# Altium footprint library PCB_CONNECTORS.PcbLib: 676 footprints (part 43 of 43)
Each footprint in its own frame and in the unit in brackets; x right, y up, seen from the top. Pads: shape width x height; smd on the part's side, far side on the other; paste and mask are expansions set on the pad; w line width, h text height; cw(c..) or ccw(c..) is an arc to the next point about the centre after c.
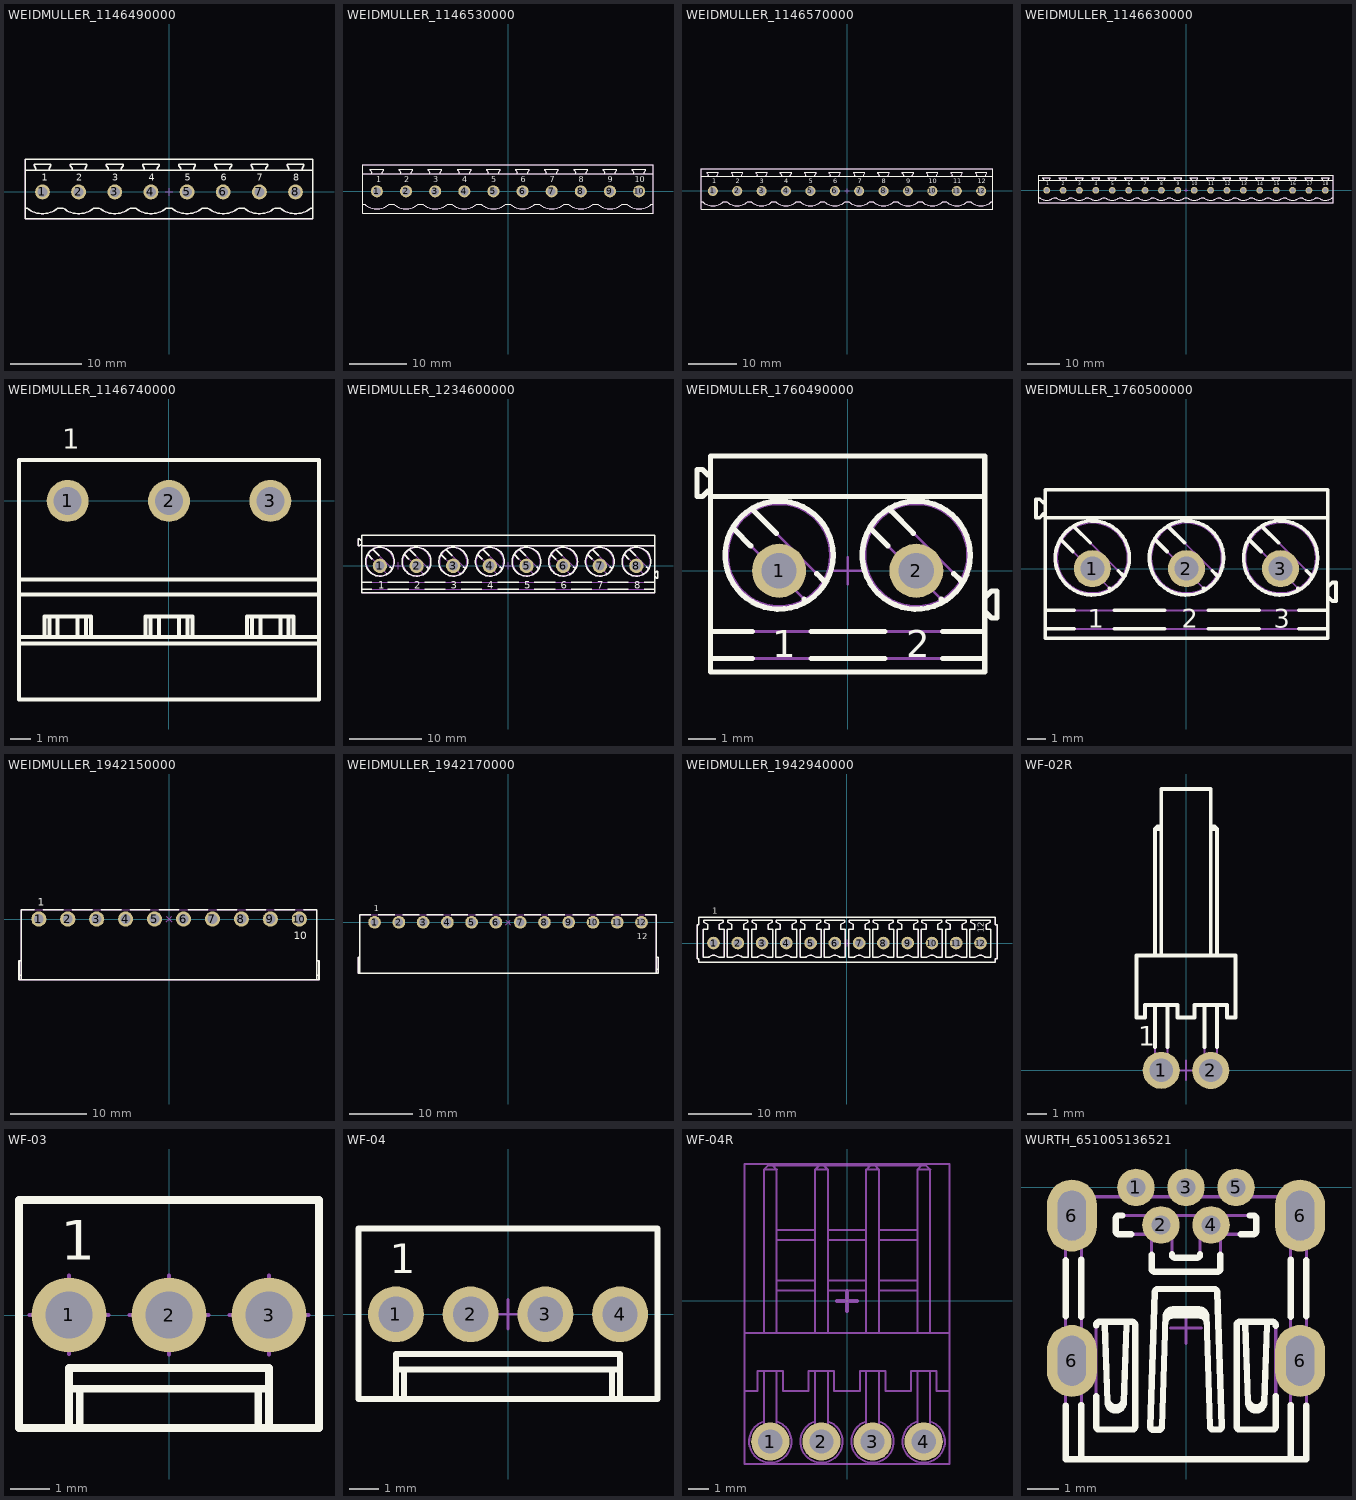
[diagram p42: the footprints below, top view; thin cyan lines are the x and y axes]

## WEIDMULLER_1146490000 [mm] "24A 400 V, Pitch 5.08mm, 8 Positions PCB Male Header, Type SL 5.08HC Serie"
height 12
pads (8):
  round 2.1 hole 1.4: 1(-17.78,0) 2(-12.7,0) 3(-7.62,0) 4(-2.54,0) 5(2.54,0) 6(7.62,0) 7(12.7,0) 8(17.78,0)
Top Overlay:
  lines w0.2: -20.22,-2.26 -19.934,-2.26 ccw(c-17.78,0.24) -15.626,-2.26 -14.854,-2.26 ccw(c-12.7,0.24) -10.546,-2.26 -9.774,-2.26 ccw(c-7.62,0.24) -5.466,-2.26 -4.694,-2.26 ccw(c-2.54,0.24) -0.386,-2.26 0.386,-2.26 ccw(c2.54,0.24) 4.694,-2.26 5.466,-2.26 ccw(c7.62,0.24) 9.774,-2.26 10.546,-2.26 ccw(c12.7,0.24) 14.854,-2.26 15.626,-2.26 ccw(c17.78,0.24) 19.934,-2.26 20.22,-2.26 ; -20.22,3.06 20.22,3.06 ; -18.7,3.06 -18.7,3.323 -18.95,3.68 -18.95,3.88 -16.61,3.88 -16.61,3.68 -16.86,3.323 -16.86,3.06 ; -13.62,3.06 -13.62,3.323 -13.87,3.68 -13.87,3.88 -11.53,3.88 -11.53,3.68 -11.78,3.323 -11.78,3.06 ; -8.54,3.06 -8.54,3.323 -8.79,3.68 -8.79,3.88 -6.45,3.88 -6.45,3.68 -6.7,3.323 -6.7,3.06 ; -3.46,3.06 -3.46,3.323 -3.71,3.68 -3.71,3.88 -1.37,3.88 -1.37,3.68 -1.62,3.323 -1.62,3.06 ; 1.62,3.06 1.62,3.323 1.37,3.68 1.37,3.88 3.71,3.88 3.71,3.68 3.46,3.323 3.46,3.06 ; 6.7,3.06 6.7,3.323 6.45,3.68 6.45,3.88 8.79,3.88 8.79,3.68 8.54,3.323 8.54,3.06 ; 11.78,3.06 11.78,3.323 11.53,3.68 11.53,3.88 13.87,3.88 13.87,3.68 13.62,3.323 13.62,3.06 ; 16.86,3.06 16.86,3.323 16.61,3.68 16.61,3.88 18.95,3.88 18.95,3.68 18.7,3.323 18.7,3.06 ; -20.22,-3.8 -20.22,4.63 20.22,4.63 20.22,-3.8 -20.22,-3.8
  text "8" at 17.44,1.6 h1
  text "7" at 12.36,1.6 h1
  text "3" at -7.96,1.6 h1
  text "1" at -17.915,1.6 h1
  text "2" at -13.04,1.6 h1
  text "4" at -2.88,1.6 h1
  text "5" at 2.2,1.6 h1
  text "6" at 7.28,1.6 h1
Mechanical 8:
  lines w0.1: -18.28,0 -17.78,0 ; -17.78,-0.5 -17.78,0 ; -17.78,0.5 -17.78,0 ; -17.28,0 -17.78,0 ; 2.04,0 2.54,0 ; 2.54,-0.5 2.54,0 ; 2.54,0.5 2.54,0 ; 3.04,0 2.54,0 ; 7.12,0 7.62,0 ; 7.62,-0.5 7.62,0 ; 7.62,0.5 7.62,0 ; 8.12,0 7.62,0 ; 12.2,0 12.7,0 ; 12.7,-0.5 12.7,0 ; 12.7,0.5 12.7,0 ; 13.2,0 12.7,0 ; 17.28,0 17.78,0 ; 17.78,-0.5 17.78,0 ; 17.78,0.5 17.78,0 ; 18.28,0 17.78,0 ; -12.7,0 -12.7,0.5 -12.7,0 ; -12.7,0 -12.2,0 -12.7,0 ; -12.7,0 -12.7,-0.5 -12.7,0 ; -12.7,0 -13.2,0 -12.7,0 ; -8.12,0 -7.62,0 ; -8.12,0 -7.62,0 ; -8.12,0 -7.62,0 ; -8.12,0 -7.62,0 ; -7.62,-0.5 -7.62,0 ; -7.62,-0.5 -7.62,0 ; -7.62,-0.5 -7.62,0 ; -7.62,-0.5 -7.62,0 ; -7.62,0 -7.62,0.5 ; -7.62,0 -7.12,0 ; -7.62,0 -7.62,0.5 ; -7.62,0 -7.12,0 ; -7.62,0 -7.62,0.5 ; -7.62,0 -7.12,0 ; -7.62,0 -7.62,0.5 ; -7.62,0 -7.12,0 ; -2.54,0 -2.54,0.5 -2.54,0 ; -2.54,0 -2.04,0 -2.54,0 ; -2.54,0 -2.54,-0.5 -2.54,0 ; -2.54,0 -3.04,0 -2.54,0 ; -0.5,0 0,0 ; -0.5,0 0,0 ; -0.5,0 0,0 ; -0.5,0 0,0 ; 0,-0.5 0,0 ; 0,-0.5 0,0 ; 0,-0.5 0,0 ; 0,-0.5 0,0 ; 0,0 0,0.5 ; 0,0 0.5,0 ; 0,0 0,0.5 ; 0,0 0.5,0 ; 0,0 0,0.5 ; 0,0 0.5,0 ; 0,0 0,0.5 ; 0,0 0.5,0
Mechanical 14:
  lines w0.1: -20.22,-2.26 -19.934,-2.26 ccw(c-17.78,0.24) -15.626,-2.26 -14.854,-2.26 ccw(c-12.7,0.24) -10.546,-2.26 -9.774,-2.26 ccw(c-7.62,0.24) -5.466,-2.26 -4.694,-2.26 ccw(c-2.54,0.24) -0.386,-2.26 0.386,-2.26 ccw(c2.54,0.24) 4.694,-2.26 5.466,-2.26 ccw(c7.62,0.24) 9.774,-2.26 10.546,-2.26 ccw(c12.7,0.24) 14.854,-2.26 15.626,-2.26 ccw(c17.78,0.24) 19.934,-2.26 20.22,-2.26 ; -20.22,3.06 20.22,3.06 ; -18.7,3.06 -18.7,3.323 -18.95,3.68 -18.95,3.88 -16.61,3.88 -16.61,3.68 -16.86,3.323 -16.86,3.06 ; -13.62,3.06 -13.62,3.323 -13.87,3.68 -13.87,3.88 -11.53,3.88 -11.53,3.68 -11.78,3.323 -11.78,3.06 ; -8.54,3.06 -8.54,3.323 -8.79,3.68 -8.79,3.88 -6.45,3.88 -6.45,3.68 -6.7,3.323 -6.7,3.06 ; -3.46,3.06 -3.46,3.323 -3.71,3.68 -3.71,3.88 -1.37,3.88 -1.37,3.68 -1.62,3.323 -1.62,3.06 ; 1.62,3.06 1.62,3.323 1.37,3.68 1.37,3.88 3.71,3.88 3.71,3.68 3.46,3.323 3.46,3.06 ; 6.7,3.06 6.7,3.323 6.45,3.68 6.45,3.88 8.79,3.88 8.79,3.68 8.54,3.323 8.54,3.06 ; 11.78,3.06 11.78,3.323 11.53,3.68 11.53,3.88 13.87,3.88 13.87,3.68 13.62,3.323 13.62,3.06 ; 16.86,3.06 16.86,3.323 16.61,3.68 16.61,3.88 18.95,3.88 18.95,3.68 18.7,3.323 18.7,3.06 ; -20.22,-3.8 -20.22,4.63 20.22,4.63 20.22,-3.8 -20.22,-3.8 ; -18.28,-0.332 -18.28,0.332 -18.112,0.5 -17.448,0.5 -17.28,0.332 -17.28,-0.332 -17.44,-0.494 -18.112,-0.5 -18.28,-0.332 ; -13.2,-0.332 -13.2,0.332 -13.032,0.5 -12.368,0.5 -12.2,0.332 -12.2,-0.332 -12.36,-0.494 -13.032,-0.5 -13.2,-0.332 ; -8.12,-0.332 -8.12,0.332 -7.952,0.5 -7.288,0.5 -7.12,0.332 -7.12,-0.332 -7.28,-0.494 -7.952,-0.5 -8.12,-0.332 ; -3.04,-0.332 -3.04,0.332 -2.872,0.5 -2.208,0.5 -2.04,0.332 -2.04,-0.332 -2.2,-0.494 -2.872,-0.5 -3.04,-0.332 ; 2.04,-0.332 2.04,0.332 2.208,0.5 2.872,0.5 3.04,0.332 3.04,-0.332 2.88,-0.494 2.208,-0.5 2.04,-0.332 ; 7.12,-0.332 7.12,0.332 7.288,0.5 7.952,0.5 8.12,0.332 8.12,-0.332 7.96,-0.494 7.288,-0.5 7.12,-0.332 ; 12.2,-0.332 12.2,0.332 12.368,0.5 13.032,0.5 13.2,0.332 13.2,-0.332 13.04,-0.494 12.368,-0.5 12.2,-0.332 ; 17.28,-0.332 17.28,0.332 17.448,0.5 18.112,0.5 18.28,0.332 18.28,-0.332 18.12,-0.494 17.448,-0.5 17.28,-0.332
  text "8" at 17.44,1.6 h1
  text "7" at 12.36,1.6 h1
  text "3" at -7.96,1.6 h1
  text "2" at -13.04,1.6 h1
  text "1" at -17.915,1.6 h1
  text "4" at -2.88,1.6 h1
  text "5" at 2.2,1.6 h1
  text "6" at 7.28,1.6 h1
3D body "WEIDMULLER_1146490000.stp": height 12, standoff -3.2, extent -20.22,-3.8 20.22,4.63

## WEIDMULLER_1146530000 [mm] "24A 400 V, Pitch 5.08mm, 10 Positions PCB Male Header, Type SL 5.08HC Serie"
height 12
pads (10):
  round 2.1 hole 1.4: 1(-22.86,0) 2(-17.78,0) 3(-12.7,0) 4(-7.62,0) 5(-2.54,0) 6(2.54,0) 7(7.62,0) 8(12.7,0) 9(17.78,0) 10(22.86,0)
Top Overlay:
  lines w0.2: -25.3,-2.26 -25.014,-2.26 ccw(c-22.86,0.24) -20.706,-2.26 -19.934,-2.26 ccw(c-17.78,0.24) -15.626,-2.26 -14.854,-2.26 ccw(c-12.7,0.24) -10.546,-2.26 -9.774,-2.26 ccw(c-7.62,0.24) -5.466,-2.26 -4.694,-2.26 ccw(c-2.54,0.24) -0.386,-2.26 0.386,-2.26 ccw(c2.54,0.24) 4.694,-2.26 5.466,-2.26 ccw(c7.62,0.24) 9.774,-2.26 10.546,-2.26 ccw(c12.7,0.24) 14.854,-2.26 15.626,-2.26 ccw(c17.78,0.24) 19.934,-2.26 20.706,-2.26 ccw(c22.86,0.24) 25.014,-2.26 25.3,-2.26 ; -25.3,3.06 25.28,3.06 ; -23.78,3.06 -23.78,3.323 -24.03,3.68 -24.03,3.88 -21.69,3.88 -21.69,3.68 -21.94,3.323 -21.94,3.06 ; -18.7,3.06 -18.7,3.323 -18.95,3.68 -18.95,3.88 -16.61,3.88 -16.61,3.68 -16.86,3.323 -16.86,3.06 ; -13.62,3.06 -13.62,3.323 -13.87,3.68 -13.87,3.88 -11.53,3.88 -11.53,3.68 -11.78,3.323 -11.78,3.06 ; -8.54,3.06 -8.54,3.323 -8.79,3.68 -8.79,3.88 -6.45,3.88 -6.45,3.68 -6.7,3.323 -6.7,3.06 ; -3.46,3.06 -3.46,3.323 -3.71,3.68 -3.71,3.88 -1.37,3.88 -1.37,3.68 -1.62,3.323 -1.62,3.06 ; 1.62,3.06 1.62,3.323 1.37,3.68 1.37,3.88 3.71,3.88 3.71,3.68 3.46,3.323 3.46,3.06 ; 6.7,3.06 6.7,3.323 6.45,3.68 6.45,3.88 8.79,3.88 8.79,3.68 8.54,3.323 8.54,3.06 ; 11.78,3.06 11.78,3.323 11.53,3.68 11.53,3.88 13.87,3.88 13.87,3.68 13.62,3.323 13.62,3.06 ; 16.86,3.06 16.86,3.323 16.61,3.68 16.61,3.88 18.95,3.88 18.95,3.68 18.7,3.323 18.7,3.06 ; 21.94,3.06 21.94,3.323 21.69,3.68 21.69,3.88 24.03,3.88 24.03,3.68 23.78,3.323 23.78,3.06 ; -25.3,-3.8 25.3,-3.8 25.3,4.63 -25.3,4.63 -25.3,-3.8
  text "6" at 2.2,1.6 h1
  text "5" at -2.88,1.6 h1
  text "4" at -7.96,1.6 h1
  text "2" at -18.12,1.6 h1
  text "1" at -22.995,1.6 h1
  text "3" at -13.04,1.6 h1
  text "7" at 7.28,1.6 h1
  text "8" at 12.36,1.6 h1
  text "10" at 22.12,1.6 h1
  text "9" at 17.44,1.6 h1
Mechanical 14:
  drawing of 176 lines, arcs and shapes, not listed
  text "6" at 2.2,1.6 h1
  text "5" at -2.88,1.6 h1
  text "4" at -7.96,1.6 h1
  text "1" at -22.995,1.6 h1
  text "2" at -18.12,1.6 h1
  text "3" at -13.04,1.6 h1
  text "7" at 7.28,1.6 h1
  text "8" at 12.36,1.6 h1
  text "10" at 22.12,1.6 h1
  text "9" at 17.44,1.6 h1
3D body "WEIDMULLER_1146530000.stp": height 12, standoff -3.2, extent -25.3,-3.8 25.3,4.63

## WEIDMULLER_1146570000 [mm] "24A 400 V, Pitch 5.08mm, 12 Positions PCB Male Header, Type SL 5.08HC Serie"
height 12
pads (12):
  round 2.1 hole 1.4: 1(-27.94,0) 2(-22.86,0) 3(-17.78,0) 4(-12.7,0) 5(-7.62,0) 6(-2.54,0) 7(2.54,0) 8(7.62,0) 9(12.7,0) 10(17.78,0) 11(22.86,0) 12(27.94,0)
Top Overlay:
  lines w0.2: -30.38,-2.26 -30.094,-2.26 ccw(c-27.94,0.24) -25.786,-2.26 -25.014,-2.26 ccw(c-22.86,0.24) -20.706,-2.26 -19.934,-2.26 ccw(c-17.78,0.24) -15.626,-2.26 -14.854,-2.26 ccw(c-12.7,0.24) -10.546,-2.26 -9.774,-2.26 ccw(c-7.62,0.24) -5.466,-2.26 -4.694,-2.26 ccw(c-2.54,0.24) -0.386,-2.26 0.386,-2.26 ccw(c2.54,0.24) 4.694,-2.26 5.466,-2.26 ccw(c7.62,0.24) 9.774,-2.26 10.546,-2.26 ccw(c12.7,0.24) 14.854,-2.26 15.626,-2.26 ccw(c17.78,0.24) 19.934,-2.26 20.706,-2.26 ccw(c22.86,0.24) 25.014,-2.26 25.786,-2.26 ccw(c27.94,0.24) 30.094,-2.26 30.38,-2.26 ; -30.38,3.06 30.38,3.06 ; -28.86,3.06 -28.86,3.323 -29.11,3.68 -29.11,3.88 -26.77,3.88 -26.77,3.68 -27.02,3.323 -27.02,3.06 ; -23.78,3.06 -23.78,3.323 -24.03,3.68 -24.03,3.88 -21.69,3.88 -21.69,3.68 -21.94,3.323 -21.94,3.06 ; -18.7,3.06 -18.7,3.323 -18.95,3.68 -18.95,3.88 -16.61,3.88 -16.61,3.68 -16.86,3.323 -16.86,3.06 ; -13.62,3.06 -13.62,3.323 -13.87,3.68 -13.87,3.88 -11.53,3.88 -11.53,3.68 -11.78,3.323 -11.78,3.06 ; -8.54,3.06 -8.54,3.323 -8.79,3.68 -8.79,3.88 -6.45,3.88 -6.45,3.68 -6.7,3.323 -6.7,3.06 ; -3.46,3.06 -3.46,3.323 -3.71,3.68 -3.71,3.88 -1.37,3.88 -1.37,3.68 -1.62,3.323 -1.62,3.06 ; 1.62,3.06 1.62,3.323 1.37,3.68 1.37,3.88 3.71,3.88 3.71,3.68 3.46,3.323 3.46,3.06 ; 6.7,3.06 6.7,3.323 6.45,3.68 6.45,3.88 8.79,3.88 8.79,3.68 8.54,3.323 8.54,3.06 ; 11.78,3.06 11.78,3.323 11.53,3.68 11.53,3.88 13.87,3.88 13.87,3.68 13.62,3.323 13.62,3.06 ; 16.86,3.06 16.86,3.323 16.61,3.68 16.61,3.88 18.95,3.88 18.95,3.68 18.7,3.323 18.7,3.06 ; 21.94,3.06 21.94,3.323 21.69,3.68 21.69,3.88 24.03,3.88 24.03,3.68 23.78,3.323 23.78,3.06 ; 27.02,3.06 27.02,3.323 26.77,3.68 26.77,3.88 29.11,3.88 29.11,3.68 28.86,3.323 28.86,3.06 ; -30.38,-3.8 -30.38,4.63 30.38,4.63 30.38,-3.8 -30.38,-3.8
  text "10" at 17.04,1.6 h1
  text "9" at 12.36,1.6 h1
  text "11" at 22.12,1.6 h1
  text "12" at 27.2,1.6 h1
  text "8" at 7.28,1.6 h1
  text "7" at 2.2,1.6 h1
  text "3" at -18.12,1.6 h1
  text "1" at -28.075,1.6 h1
  text "2" at -23.2,1.6 h1
  text "4" at -13.04,1.6 h1
  text "5" at -7.96,1.6 h1
  text "6" at -2.88,1.6 h1
Mechanical 8:
  lines w0.1: -28.44,0 -27.94,0 ; -27.94,-0.5 -27.94,0 ; -27.94,0.5 -27.94,0 ; -27.44,0 -27.94,0 ; -23.36,0 -22.86,0 ; -22.86,-0.5 -22.86,0 ; -22.86,0.5 -22.86,0 ; -22.36,0 -22.86,0 ; -18.28,0 -17.78,0 ; -17.78,-0.5 -17.78,0 ; -17.78,0.5 -17.78,0 ; -17.28,0 -17.78,0 ; 2.04,0 2.54,0 ; 2.54,-0.5 2.54,0 ; 2.54,0.5 2.54,0 ; 3.04,0 2.54,0 ; 7.12,0 7.62,0 ; 7.62,-0.5 7.62,0 ; 7.62,0.5 7.62,0 ; 8.12,0 7.62,0 ; 12.2,0 12.7,0 ; 12.7,-0.5 12.7,0 ; 12.7,0.5 12.7,0 ; 13.2,0 12.7,0 ; 17.28,0 17.78,0 ; 17.78,-0.5 17.78,0 ; 17.78,0.5 17.78,0 ; 18.28,0 17.78,0 ; 22.36,0 22.86,0 ; 22.86,-0.5 22.86,0 ; 22.86,0.5 22.86,0 ; 23.36,0 22.86,0 ; 27.44,0 27.94,0 ; 27.94,-0.5 27.94,0 ; 27.94,0.5 27.94,0 ; 28.44,0 27.94,0 ; -12.7,0 -12.7,0.5 -12.7,0 ; -12.7,0 -12.2,0 -12.7,0 ; -12.7,0 -12.7,-0.5 -12.7,0 ; -12.7,0 -13.2,0 -12.7,0 ; -8.12,0 -7.62,0 ; -8.12,0 -7.62,0 ; -8.12,0 -7.62,0 ; -8.12,0 -7.62,0 ; -7.62,-0.5 -7.62,0 ; -7.62,-0.5 -7.62,0 ; -7.62,-0.5 -7.62,0 ; -7.62,-0.5 -7.62,0 ; -7.62,0 -7.62,0.5 ; -7.62,0 -7.12,0 ; -7.62,0 -7.62,0.5 ; -7.62,0 -7.12,0 ; -7.62,0 -7.62,0.5 ; -7.62,0 -7.12,0 ; -7.62,0 -7.62,0.5 ; -7.62,0 -7.12,0 ; -2.54,0 -2.54,0.5 -2.54,0 ; -2.54,0 -2.04,0 -2.54,0 ; -2.54,0 -2.54,-0.5 -2.54,0 ; -2.54,0 -3.04,0 -2.54,0 ; -0.5,0 0,0 ; -0.5,0 0,0 ; -0.5,0 0,0 ; -0.5,0 0,0 ; 0,-0.5 0,0 ; 0,-0.5 0,0 ; 0,-0.5 0,0 ; 0,-0.5 0,0 ; 0,0 0,0.5 ; 0,0 0.5,0 ; 0,0 0,0.5 ; 0,0 0.5,0 ; 0,0 0,0.5 ; 0,0 0.5,0 ; 0,0 0,0.5 ; 0,0 0.5,0
Mechanical 14:
  drawing of 210 lines, arcs and shapes, not listed
  text "10" at 17.04,1.6 h1
  text "9" at 12.36,1.6 h1
  text "11" at 22.12,1.6 h1
  text "12" at 27.2,1.6 h1
  text "8" at 7.28,1.6 h1
  text "7" at 2.2,1.6 h1
  text "3" at -18.12,1.6 h1
  text "2" at -23.2,1.6 h1
  text "1" at -28.075,1.6 h1
  text "4" at -13.04,1.6 h1
  text "5" at -7.96,1.6 h1
  text "6" at -2.88,1.6 h1
3D body "WEIDMULLER_1146570000.stp": height 12, standoff -3.2, extent -30.38,-3.8 30.38,4.63

## WEIDMULLER_1146630000 [mm] "24A 400 V, Pitch 5.08mm, 18 Positions PCB Male Header, Type SL 5.08HC Serie"
height 12
pads (18):
  round 2.1 hole 1.4: 1(-43.18,0) 2(-38.1,0) 3(-33.02,0) 4(-27.94,0) 5(-22.86,0) 6(-17.78,0) 7(-12.7,0) 8(-7.62,0) 9(-2.54,0) 10(2.54,0) 11(7.62,0) 12(12.7,0) 13(17.78,0) 14(22.86,0) 15(27.94,0) 16(33.02,0) 17(38.1,0) 18(43.18,0)
Top Overlay:
  drawing of 168 lines, arcs and shapes, not listed
  text "16" at 32.28,1.6 h1
  text "15" at 27.225,1.6 h1
  text "17" at 37.36,1.6 h1
  text "18" at 42.44,1.6 h1
  text "14" at 22.145,1.6 h1
  text "13" at 17.065,1.6 h1
  text "6" at -18.12,1.6 h1
  text "5" at -23.2,1.6 h1
  text "4" at -28.28,1.6 h1
  text "2" at -38.44,1.6 h1
  text "1" at -43.315,1.6 h1
  text "3" at -33.36,1.6 h1
  text "7" at -13.04,1.6 h1
  text "8" at -7.96,1.6 h1
  text "12" at 11.96,1.6 h1
  text "11" at 6.88,1.6 h1
  text "9" at -2.88,1.6 h1
  text "10" at 1.8,1.6 h1
Mechanical 8:
  lines w0.1: -43.68,0 -43.18,0 ; -43.18,-0.5 -43.18,0 ; -43.18,0.5 -43.18,0 ; -42.68,0 -43.18,0 ; -38.6,0 -38.1,0 ; -38.1,-0.5 -38.1,0 ; -38.1,0.5 -38.1,0 ; -37.6,0 -38.1,0 ; -33.52,0 -33.02,0 ; -33.02,-0.5 -33.02,0 ; -33.02,0.5 -33.02,0 ; -32.52,0 -33.02,0 ; -28.44,0 -27.94,0 ; -27.94,-0.5 -27.94,0 ; -27.94,0.5 -27.94,0 ; -27.44,0 -27.94,0 ; -23.36,0 -22.86,0 ; -22.86,-0.5 -22.86,0 ; -22.86,0.5 -22.86,0 ; -22.36,0 -22.86,0 ; -18.28,0 -17.78,0 ; -17.78,-0.5 -17.78,0 ; -17.78,0.5 -17.78,0 ; -17.28,0 -17.78,0 ; 2.04,0 2.54,0 ; 2.54,-0.5 2.54,0 ; 2.54,0.5 2.54,0 ; 3.04,0 2.54,0 ; 7.12,0 7.62,0 ; 7.62,-0.5 7.62,0 ; 7.62,0.5 7.62,0 ; 8.12,0 7.62,0 ; 12.2,0 12.7,0 ; 12.7,-0.5 12.7,0 ; 12.7,0.5 12.7,0 ; 13.2,0 12.7,0 ; 17.28,0 17.78,0 ; 17.78,-0.5 17.78,0 ; 17.78,0.5 17.78,0 ; 18.28,0 17.78,0 ; 22.36,0 22.86,0 ; 22.86,-0.5 22.86,0 ; 22.86,0.5 22.86,0 ; 23.36,0 22.86,0 ; 27.44,0 27.94,0 ; 27.94,-0.5 27.94,0 ; 27.94,0.5 27.94,0 ; 28.44,0 27.94,0 ; 32.52,0 33.02,0 ; 33.02,-0.5 33.02,0 ; 33.02,0.5 33.02,0 ; 33.52,0 33.02,0 ; 37.6,0 38.1,0 ; 38.1,-0.5 38.1,0 ; 38.1,0.5 38.1,0 ; 38.6,0 38.1,0 ; 42.68,0 43.18,0 ; 43.18,-0.5 43.18,0 ; 43.18,0.5 43.18,0 ; 43.68,0 43.18,0 ; -12.7,0 -13.2,0 -12.7,0 ; -12.7,0 -12.7,-0.5 -12.7,0 ; -12.7,0 -12.2,0 -12.7,0 ; -12.7,0 -12.7,0.5 -12.7,0 ; -8.12,0 -7.62,0 ; -8.12,0 -7.62,0 ; -8.12,0 -7.62,0 ; -8.12,0 -7.62,0 ; -7.62,-0.5 -7.62,0 ; -7.62,-0.5 -7.62,0 ; -7.62,-0.5 -7.62,0 ; -7.62,-0.5 -7.62,0 ; -7.62,0 -7.12,0 ; -7.62,0 -7.62,0.5 ; -7.62,0 -7.12,0 ; -7.62,0 -7.62,0.5 ; -7.62,0 -7.12,0 ; -7.62,0 -7.62,0.5 ; -7.62,0 -7.12,0 ; -7.62,0 -7.62,0.5 ; -2.54,0 -3.04,0 -2.54,0 ; -2.54,0 -2.54,-0.5 -2.54,0 ; -2.54,0 -2.04,0 -2.54,0 ; -2.54,0 -2.54,0.5 -2.54,0 ; -0.5,0 0,0 ; -0.5,0 0,0 ; -0.5,0 0,0 ; -0.5,0 0,0 ; 0,-0.5 0,0 ; 0,-0.5 0,0 ; 0,-0.5 0,0 ; 0,-0.5 0,0 ; 0,0 0.5,0 ; 0,0 0,0.5 ; 0,0 0.5,0 ; 0,0 0,0.5 ; 0,0 0.5,0 ; 0,0 0,0.5 ; 0,0 0.5,0 ; 0,0 0,0.5
Mechanical 14:
  drawing of 312 lines, arcs and shapes, not listed
  text "16" at 32.28,1.6 h1
  text "15" at 27.225,1.6 h1
  text "17" at 37.36,1.6 h1
  text "18" at 42.44,1.6 h1
  text "14" at 22.145,1.6 h1
  text "13" at 17.065,1.6 h1
  text "6" at -18.12,1.6 h1
  text "5" at -23.2,1.6 h1
  text "4" at -28.28,1.6 h1
  text "1" at -43.315,1.6 h1
  text "2" at -38.44,1.6 h1
  text "3" at -33.36,1.6 h1
  text "7" at -13.04,1.6 h1
  text "8" at -7.96,1.6 h1
  text "12" at 11.96,1.6 h1
  text "11" at 6.88,1.6 h1
  text "9" at -2.88,1.6 h1
  text "10" at 1.8,1.6 h1
3D body "WEIDMULLER_1146630000.stp": height 12, standoff -3.2, extent -45.62,-3.8 45.62,4.63

## WEIDMULLER_1146740000 [mm] "15A 300 V, Pitch 5.08mm, 3 Positions PCB Right Angle Male Header, BL/SL 5.08 serie"
height 8.5
pads (3):
  round 2.1 hole 1.4: 1(-5.08,0) 2(0,0) 3(5.08,0)
Top Overlay:
  lines w0.2: -7.52,-7.15 7.52,-7.15 ; -7.52,-6.83 7.52,-6.83 ; -7.52,-4.68 7.52,-4.68 ; -7.52,-3.93 7.52,-3.93 ; -6.25,-6.83 -6.25,-5.8 -3.91,-5.8 -3.91,-6.83 ; -6,-6.83 -6,-5.8 ; -5.58,-6.83 -5.58,-5.8 ; -4.58,-6.83 -4.58,-5.8 ; -4.16,-6.83 -4.16,-5.8 ; -1.17,-6.83 -1.17,-5.8 1.17,-5.8 1.17,-6.83 ; -0.92,-6.83 -0.92,-5.8 ; -0.5,-6.83 -0.5,-5.8 ; 0.5,-6.83 0.5,-5.8 ; 0.92,-6.83 0.92,-5.8 ; 3.91,-6.83 3.91,-5.8 6.25,-5.8 6.25,-6.83 ; 4.16,-6.83 4.16,-5.8 ; 4.58,-6.83 4.58,-5.8 ; 5.58,-6.83 5.58,-5.8 ; 6,-6.83 6,-5.8 ; -7.52,-9.95 7.52,-9.95 7.52,2.05 -7.52,2.05 -7.52,-9.95
  text "1" at -5.35,2.625 h1
Mechanical 8:
  lines w0.1: -5.58,0 -5.08,0 ; -5.08,-0.5 -5.08,0 ; -5.08,0.5 -5.08,0 ; -4.58,0 -5.08,0 ; -0.5,0 0,0 ; 0,-0.5 0,0 ; 0,0.5 0,0 ; 0.5,0 0,0 ; 4.58,0 5.08,0 ; 5.08,-0.5 5.08,0 ; 5.08,0.5 5.08,0 ; 5.58,0 5.08,0
Mechanical 14:
  lines w0.1: -7.52,-7.15 7.52,-7.15 ; -7.52,-6.83 7.52,-6.83 ; -7.52,-4.68 7.52,-4.68 ; -7.52,-3.93 7.52,-3.93 ; -6.25,-6.83 -6.25,-5.8 -3.91,-5.8 -3.91,-6.83 ; -6,-6.83 -6,-5.8 ; -5.58,-6.83 -5.58,-5.8 ; -4.58,-6.83 -4.58,-5.8 ; -4.16,-6.83 -4.16,-5.8 ; -1.17,-6.83 -1.17,-5.8 1.17,-5.8 1.17,-6.83 ; -0.92,-6.83 -0.92,-5.8 ; -0.5,-6.83 -0.5,-5.8 ; 0.5,-6.83 0.5,-5.8 ; 0.92,-6.83 0.92,-5.8 ; 3.91,-6.83 3.91,-5.8 6.25,-5.8 6.25,-6.83 ; 4.16,-6.83 4.16,-5.8 ; 4.58,-6.83 4.58,-5.8 ; 5.58,-6.83 5.58,-5.8 ; 6,-6.83 6,-5.8 ; -7.52,-9.95 7.52,-9.95 7.52,2.05 -7.52,2.05 -7.52,-9.95
  text "1" at -5.42,-2.65 h1
  text "2" at -0.34,-2.65 h1
  text "3" at 4.74,-2.65 h1
3D body "WEIDMULLER_1146740000.stp": height 8.43, standoff -3.2, extent -7.52,-9.95 7.52,2.05

## WEIDMULLER_1234600000 [mm] "Terminal Block, 24A 600V, Pitch 5.08mm, 8 Positions, Screw Connection"
height 10
pads (8):
  round 2 hole 1.3: 1(-17.78,0) 2(-12.7,0) 3(-7.62,0) 4(-2.54,0) 5(2.54,0) 6(7.62,0) 7(12.7,0) 8(17.78,0)
Top Overlay:
  circle w0.2: c17.78,0.577 r2
  circle w0.2: c12.7,0.577 r2
  circle w0.2: c7.62,0.577 r2
  circle w0.2: c2.54,0.577 r2
  circle w0.2: c-2.54,0.577 r2
  circle w0.2: c-7.62,0.577 r2
  circle w0.2: c-17.78,0.577 r2
  circle w0.2: c-12.7,0.577 r2
  lines w0.2: -20.32,-3.25 -18.88,-3.25 ; -20.32,-2.25 -18.88,-2.25 ; -20.32,2.75 20.32,2.75 ; -20.32,2.95 -20.42,2.95 -20.62,2.75 -20.82,2.75 -20.82,3.75 -20.62,3.75 -20.42,3.55 -20.32,3.55 ; -19.43,1.52 -18.833,0.923 ; -18.723,2.227 -17.891,1.396 ; -16.857,-1.053 -16.837,-1.073 ; -16.68,-3.25 -13.8,-3.25 ; -16.68,-2.25 -13.8,-2.25 ; -16.384,-0.111 -16.13,-0.366 ; -14.35,1.52 -13.753,0.923 ; -13.643,2.227 -12.811,1.396 ; -11.777,-1.053 -11.757,-1.073 ; -11.6,-3.25 -8.72,-3.25 ; -11.6,-2.25 -8.72,-2.25 ; -11.304,-0.111 -11.05,-0.366 ; -9.27,1.52 -8.673,0.923 ; -8.563,2.227 -7.731,1.396 ; -6.697,-1.053 -6.677,-1.073 ; -6.52,-3.25 -3.64,-3.25 ; -6.52,-2.25 -3.64,-2.25 ; -6.224,-0.111 -5.97,-0.366 ; -4.19,1.52 -3.593,0.923 ; -3.483,2.227 -2.651,1.396 ; -1.617,-1.053 -1.597,-1.073 ; -1.44,-3.25 1.44,-3.25 ; -1.44,-2.25 1.44,-2.25 ; -1.144,-0.111 -0.89,-0.366 ; 0.89,1.52 1.487,0.923 ; 1.597,2.227 2.429,1.396 ; 3.463,-1.053 3.483,-1.073 ; 3.64,-3.25 6.52,-3.25 ; 3.64,-2.25 6.52,-2.25 ; 3.936,-0.111 4.19,-0.366 ; 5.97,1.52 6.567,0.923 ; 6.677,2.227 7.509,1.396 ; 8.543,-1.053 8.563,-1.073 ; 8.72,-3.25 11.6,-3.25 ; 8.72,-2.25 11.6,-2.25 ; 9.016,-0.111 9.27,-0.366 ; 11.05,1.52 11.647,0.923 ; 11.757,2.227 12.589,1.396 ; 13.623,-1.053 13.643,-1.073 ; 13.8,-3.25 16.68,-3.25 ; 13.8,-2.25 16.68,-2.25 ; 14.096,-0.111 14.35,-0.366 ; 16.13,1.52 16.727,0.923 ; 16.837,2.227 17.669,1.396 ; 18.703,-1.053 18.723,-1.073 ; 18.88,-3.25 20.32,-3.25 ; 18.88,-2.25 20.32,-2.25 ; 19.176,-0.111 19.43,-0.366 ; 20.32,-1.55 20.37,-1.55 20.57,-1.75 20.77,-1.75 20.77,-0.75 20.57,-0.75 20.37,-0.95 20.32,-0.95 ; -20.32,-3.75 -20.32,4.25 20.32,4.25 20.32,-3.75 -20.32,-3.75
  text "8" at 17.453,-3.2 h1
  text "7" at 12.373,-3.2 h1
  text "6" at 7.293,-3.2 h1
  text "5" at 2.213,-3.2 h1
  text "4" at -2.867,-3.2 h1
  text "3" at -7.947,-3.2 h1
  text "2" at -13.027,-3.2 h1
  text "1" at -18.032,-3.2 h1
Mechanical 8:
  lines w0.1: -18.28,0 -17.78,0 ; -17.78,-0.5 -17.78,0 ; -17.78,0.5 -17.78,0 ; -17.28,0 -17.78,0 ; -15.74,0 -15.24,0 ; -15.24,-0.5 -15.24,0 ; -15.24,0.5 -15.24,0 ; -14.74,0 -15.24,0 ; -13.2,0 -12.7,0 ; -12.7,-0.5 -12.7,0 ; -12.7,0.5 -12.7,0 ; -12.2,0 -12.7,0 ; -8.12,0 -7.62,0 ; -7.62,-0.5 -7.62,0 ; -7.62,0.5 -7.62,0 ; -7.12,0 -7.62,0 ; -3.04,0 -2.54,0 ; -2.54,-0.5 -2.54,0 ; -2.54,0.5 -2.54,0 ; -2.04,0 -2.54,0 ; -0.5,0 0,0 ; 0,-0.5 0,0 ; 0,0.5 0,0 ; 0.5,0 0,0 ; 2.04,0 2.54,0 ; 2.54,-0.5 2.54,0 ; 2.54,0.5 2.54,0 ; 3.04,0 2.54,0 ; 7.12,0 7.62,0 ; 7.62,-0.5 7.62,0 ; 7.62,0.5 7.62,0 ; 8.12,0 7.62,0 ; 12.2,0 12.7,0 ; 12.7,-0.5 12.7,0 ; 12.7,0.5 12.7,0 ; 13.2,0 12.7,0 ; 17.28,0 17.78,0 ; 17.78,-0.5 17.78,0 ; 17.78,0.5 17.78,0 ; 18.28,0 17.78,0
Mechanical 14:
  circle w0.1: c17.78,0.577 r1.9
  circle w0.1: c17.78,0.577 r2
  circle w0.1: c12.7,0.577 r1.9
  circle w0.1: c12.7,0.577 r2
  circle w0.1: c7.62,0.577 r1.9
  circle w0.1: c7.62,0.577 r2
  circle w0.1: c2.54,0.577 r1.9
  circle w0.1: c2.54,0.577 r2
  circle w0.1: c-2.54,0.577 r1.9
  circle w0.1: c-2.54,0.577 r2
  circle w0.1: c-7.62,0.577 r1.9
  circle w0.1: c-7.62,0.577 r2
  circle w0.1: c-17.78,0.577 r1.9
  circle w0.1: c-17.78,0.577 r2
  circle w0.1: c-12.7,0.577 r1.9
  circle w0.1: c-12.7,0.577 r2
  lines w0.1: -20.32,-3.25 20.32,-3.25 ; -20.32,-2.25 20.32,-2.25 ; -20.32,2.75 20.32,2.75 ; -20.32,2.95 -20.42,2.95 -20.62,2.75 -20.82,2.75 -20.82,3.75 -20.62,3.75 -20.42,3.55 -20.32,3.55 ; -19.43,1.52 -16.837,-1.073 ; -18.723,2.227 -16.13,-0.366 ; -14.35,1.52 -11.757,-1.073 ; -13.643,2.227 -11.05,-0.366 ; -9.27,1.52 -6.677,-1.073 ; -8.563,2.227 -5.97,-0.366 ; -4.19,1.52 -1.597,-1.073 ; -3.483,2.227 -0.89,-0.366 ; 0.89,1.52 3.483,-1.073 ; 1.597,2.227 4.19,-0.366 ; 5.97,1.52 8.563,-1.073 ; 6.677,2.227 9.27,-0.366 ; 11.05,1.52 13.643,-1.073 ; 11.757,2.227 14.35,-0.366 ; 16.13,1.52 18.723,-1.073 ; 16.837,2.227 19.43,-0.366 ; 20.32,-1.55 20.37,-1.55 20.57,-1.75 20.77,-1.75 20.77,-0.75 20.57,-0.75 20.37,-0.95 20.32,-0.95 ; -20.32,-3.75 -20.32,4.25 20.32,4.25 20.32,-3.75 -20.32,-3.75